# Altium footprint library PCBLIB.PcbLib: 557 footprints (part 7 of 36)
Each footprint in its own frame and in the unit in brackets; x right, y up, seen from the top. Pads: shape width x height; smd on the part's side, far side on the other; paste and mask are expansions set on the pad; w line width, h text height; cw(c..) or ccw(c..) is an arc to the next point about the centre after c.
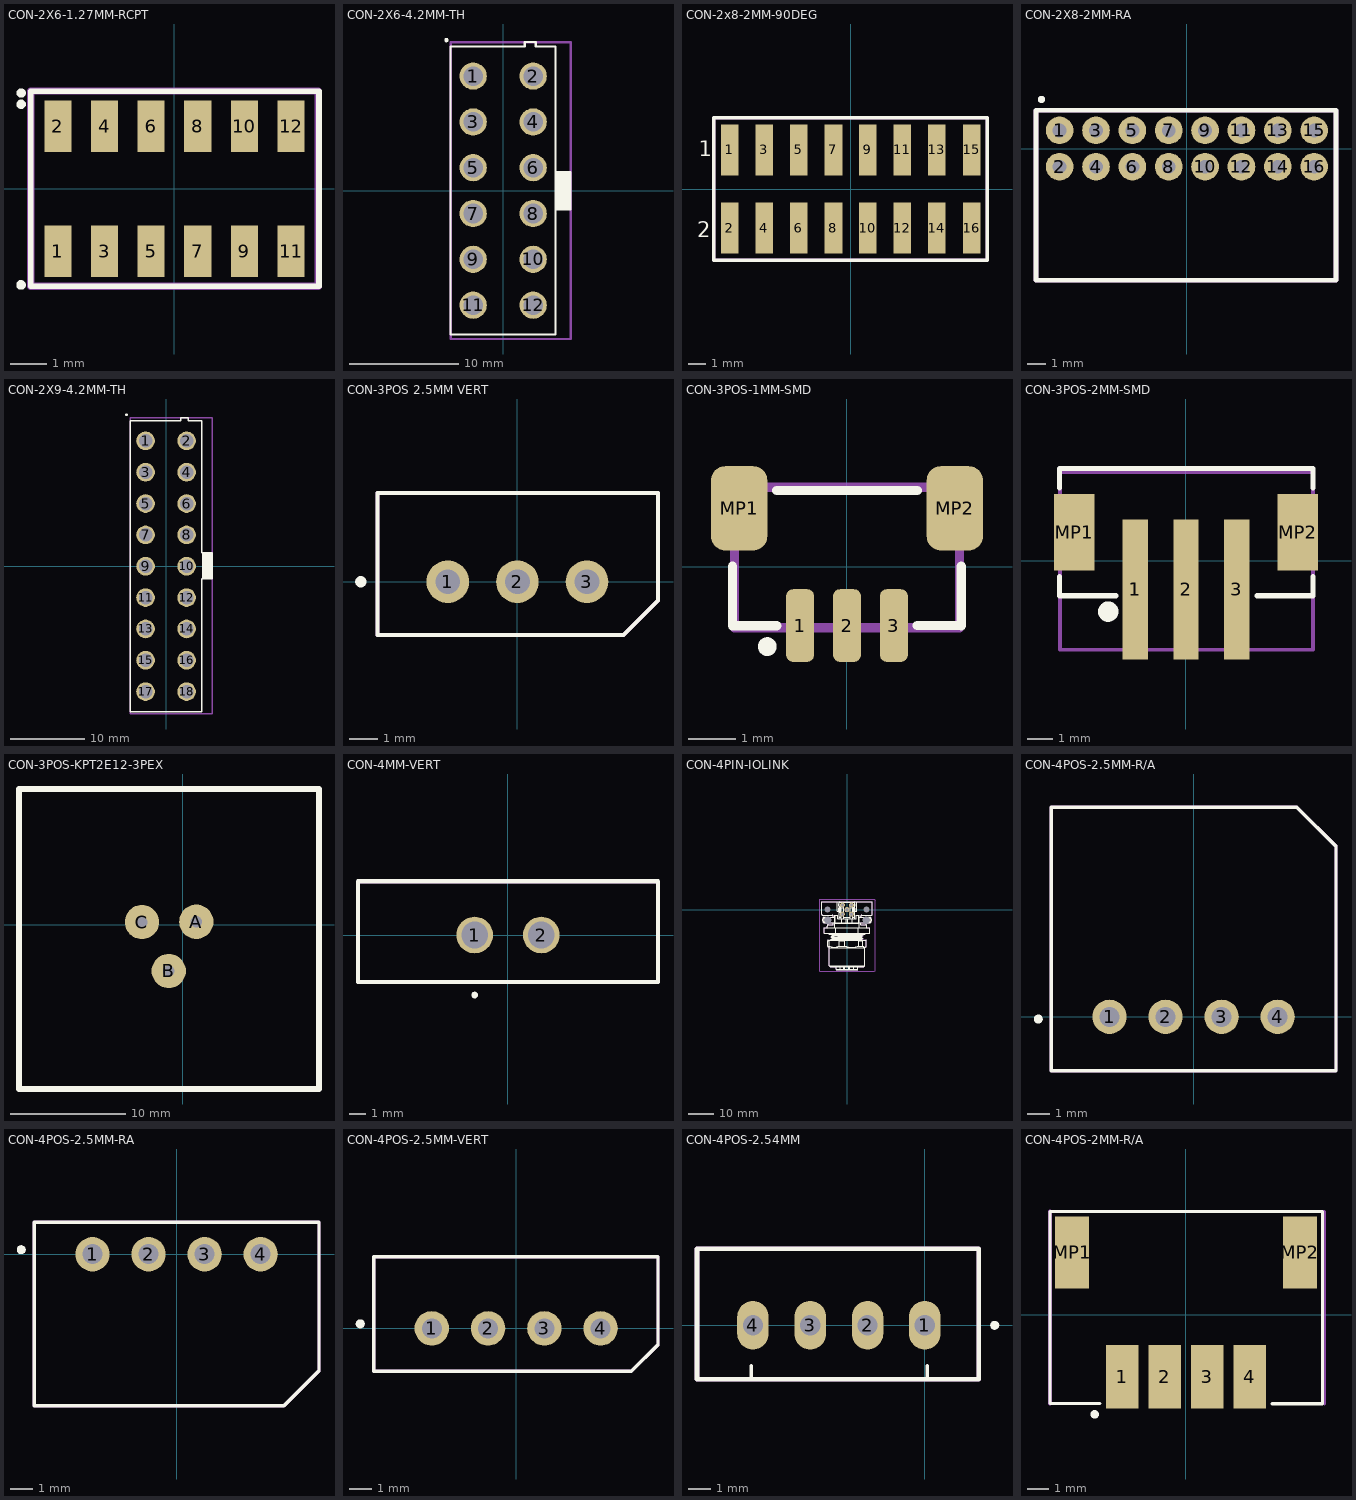
[diagram p6: the footprints below, top view; thin cyan lines are the x and y axes]

## CON-2X6-1.27MM-RCPT [mm] "CONN RCPT 12POS 0.05 GOLD SMD"
pads (12):
  rect 0.74x1.4 smd mask+0.05: 1(-3.175,-1.7) 2(-3.175,1.7) 3(-1.905,-1.7) 4(-1.905,1.7) 5(-0.635,-1.7) 6(-0.635,1.7) 7(0.635,-1.7) 8(0.635,1.7) 9(1.905,-1.7) 10(1.905,1.7) 11(3.175,-1.7) 12(3.175,1.7)
Top Overlay:
  circle w0.15: c-4.18,-2.62 r0.055
  circle w0.15: c-4.176,2.3 r0.051
  circle w0.15: c-4.176,2.605 r0.051
  lines w0.15: -3.912,-2.66 -3.912,2.66 1.79,2.66 3.937,2.66 3.937,-2.66 -3.912,-2.66
ASM Top:
  lines w0.2: -3.912,-2.66 3.912,-2.66 3.912,2.66 -3.912,2.66 -3.912,-2.66
  text ".designator" at -2.85,-0.24 h0.8
3D body "FLE-106-01-G-DV-K-TR.stp": height 4.69, standoff 0.01, extent -3.867,-2.297 3.867,2.297

## CON-2X6-4.2MM-TH [mm]
pads (12):
  round 2.5 hole 1.8: 1(-2.75,10.5) 2(2.75,10.5) 3(-2.75,6.3) 4(2.75,6.3) 5(-2.75,2.1) 6(2.75,2.1) 7(-2.75,-2.1) 8(2.75,-2.1) 9(-2.75,-6.3) 10(2.75,-6.3) 11(-2.75,-10.5) 12(2.75,-10.5)
Top Overlay:
  circle w0.2: c-5.2,13.8 r0.1
  rectangle: 4.787,-1.7 6.187,1.7
  lines w0.2: 4.787,12.224 4.787,-1.7 ; 4.787,-1.7 6.187,-1.7 6.187,1.7 4.787,1.7 4.787,13.224 2.988,13.224 2.988,13.624 1.977,13.624 1.977,13.224 -4.813,13.224 -4.813,-13.2 4.787,-13.2 4.787,-1.7
ASM Top:
  lines w0.2: -4.812,-13.6 6.188,-13.6 6.188,13.6 -4.812,13.6 -4.812,-13.6
  text ".designator" at -2.1,0 h0.8
3D body "039293126.stp": height 12.81, standoff -3.49, extent -4.8,-13.6 6.2,13.6

## CON-2x8-2MM-90DEG [mil]
pads (16):
  rect 40x116 smd: 1(-276,89) 2(-276,-89) 3(-197,89) 4(-197,-89) 5(-118,89) 6(-118,-89) 7(-39,89) 8(-39,-89) 9(39,89) 10(39,-89) 11(118,89) 12(118,-89) 13(197,89) 14(197,-89) 15(276,89) 16(276,-89)
Top Overlay:
  lines w8: -312,-163 -312,163 312,163 312,-163 -312,-163
  text "1" at -346.46,62.99 h60
  text "2" at -350.39,-122.05 h60
ASM Top:
  lines w8: -312,-163 -312,163 312,163 312,-163 -312,-163
  text ".designator" at -299,-13 h31.5
3D body "2x8 2mm 90.stp": height 235.5, standoff 0.5, extent -313.95,-139.99 315.97,138.01

## CON-2X8-2MM-RA [mil]
pads (16):
  round 60 hole 30: 1(-275.59,39.37) 2(-275.59,-39.37) 3(-196.85,39.37) 4(-196.85,-39.37) 5(-118.11,39.37) 6(-118.11,-39.37) 7(-39.37,39.37) 8(-39.37,-39.37) 9(39.37,39.37) 10(39.37,-39.37) 11(118.11,39.37) 12(118.11,-39.37) 13(196.85,39.37) 14(196.85,-39.37) 15(275.59,39.37) 16(275.59,-39.37)
Top Overlay:
  circle w7.87: c-314.96,106.3 r3.94
  lines w10: -326.77,-285.52 -326.77,82.68 322.83,82.68 322.83,-285.52 -326.77,-285.52
ASM Top:
  lines w10: -326.77,-285.52 322.83,-285.52 322.83,82.68 -326.77,82.68 -326.77,-285.52
  text ".designator" at -303.15,-122.05 h31.5
3D body "2x8-2MM-RA-HEADER.stp": height 159.3, standoff -116.61, extent -314.96,-285.52 314.96,49.3

## CON-2X9-4.2MM-TH [mm]
pads (18):
  round 2.5 hole 1.8: 1(-2.75,16.8) 2(2.75,16.8) 3(-2.75,12.6) 4(2.75,12.6) 5(-2.75,8.4) 6(2.75,8.4) 7(-2.75,4.2) 8(2.75,4.2) 9(-2.75,0) 10(2.75,0) 11(-2.75,-4.2) 12(2.75,-4.2) 13(-2.75,-8.4) 14(2.75,-8.4) 15(-2.75,-12.6) 16(2.75,-12.6) 17(-2.75,-16.8) 18(2.75,-16.8)
Top Overlay:
  circle w0.2: c-5.3,20.3 r0.1
  rectangle: 4.787,-1.7 6.187,1.7
  lines w0.2: 4.787,4.6 4.787,18.524 ; -4.813,-19.5 -4.813,19.524 1.977,19.524 1.977,19.924 2.988,19.924 2.988,19.524 4.787,19.524 4.787,1.8 6.187,1.8 6.187,-1.7 4.787,-1.7 4.787,-19.5 -4.813,-19.5
ASM Top:
  lines w0.2: -4.812,-19.8 -4.812,19.9 6.188,19.9 6.188,-19.8 -4.812,-19.8
  text ".designator" at -2.75,0 h0.8
3D body "039281183.stp": height 12.81, standoff -3.49, extent -4.8,-19.9 6.2,19.9

## CON-3POS 2.5MM VERT [mil]
pads (3):
  round 60 hole 35: 1(-98,0) 2(0,0) 3(98,0)
Top Overlay:
  circle w7.87: c-220.47,0 r3.94
  lines w6: -197,-75 149.41,-75 198,-26.41 198,125 -197,125 -197,-75
ASM Top:
  lines w6: -197,-75 149.41,-75 198,-26.41 198,125 -197,125 -197,-75
  text ".designator" at -47.24,47.24 h31.5
3D body "022035035.stp": height 231.14, standoff -138.94, extent -194.88,-72.05 194.88,120.87

## CON-3POS-1MM-SMD [mm]
pads (5):
  rrect50% 0.6x1.55 smd mask+0.05: 1(-1,-1.25) 2(0,-1.25) 3(1,-1.25)
  rrect50% 1.2x1.8 smd mask+0.05: MP1(-2.3,1.25) MP2(2.3,1.25)
Top Overlay:
  circle w0.2: c-1.7,-1.7 r0.1
  lines w0.2: -2.442,0.015 -2.442,-1.251 -1.5,-1.251 ; -1.5,1.631 1.5,1.631 ; 1.5,-1.25 2.44,-1.25 ; 2.441,-1.251 2.441,0.015
ASM Top:
  lines w0.2: -2.4,1.7 -2.4,-1.3 2.4,-1.3 2.4,1.7 -2.35,1.7
  text ".designator" at -0.4,-0.2 h0.8
3D body "5013310307.stp": height 5.5, standoff -0.04, extent -2.62,-1.91 2.62,1.94

## CON-3POS-2MM-SMD [mm]
pads (6):
  rect 1x5.5 smd: 1(-2,-1.125) 1(-2,-1.125) 2(0,-1.125) 3(2,-1.125)
  rect 1.6x3 smd: MP1(-4.4,1.125) MP2(4.4,1.125)
Top Overlay:
  circle w0.4: c-3.058,-1.999 r0.2
  lines w0.2: -4.975,-0.625 -4.975,-1.375 -2.75,-1.375 ; -4.975,2.875 -4.975,3.625 5,3.625 5,2.875 ; 2.8,-1.375 5,-1.375 5,-0.625
ASM Top:
  lines w0.152: -4.95,3.5 -4.95,-3.5 5,-3.5 5,1.5 5,3.5 -4.95,3.5 ; -4.95,3.5 -4.95,3.5
  text ".designator" at -1.4,-0.4 h0.8
3D body "B3B-PH-SM4-TB.STEP": height 6.61, standoff 0.01, extent -4.975,-3.5 4.975,3.5

## CON-3POS-KPT2E12-3PEX [mm]
pads (3):
  round 3 hole 1: A(1.18,0.25) B(-1.22,-4.04) C(-3.56,0.23)
Top Overlay:
  lines w0.5: -14.282,-14.325 -14.282,11.825 11.878,11.825 11.878,-14.325 -14.282,-14.325
3D body "KPT2E123PEX.stp": height 20.39, standoff -9.37, extent -14.282,-14.325 11.878,11.825

## CON-4MM-VERT [mm]
pads (2):
  round 2.2 hole 1.6: 1(-2,0) 2(2,0)
Top Overlay:
  circle w0.2: c-2,-3.6 r0.1
  lines w0.254: -9,-2.825 9,-2.825 9,3.225 -9,3.225 -9,-2.825
ASM Top:
  lines w0.2: -9,-2.8 -9,3.2 9,3.2 9,-2.8 -9,-2.8
  text ".designator" at -1.6,-0.2 h0.8
3D body "CON-HARWIN.stp": height 5.6, standoff -3.3, extent -9,-2.825 9,3.225

## CON-4PIN-IOLINK [mm]
height 32
pads (9):
  round 1.9 hole 1.3: 1(-1.77,1.77) 2(1.77,1.77) 3(1.77,-1.77) 4(-1.77,-1.77) 5(0,0)
  round 0 hole 2.35 unplated: MH1(-7.5,0) MH2(7.5,0)
  round 0 hole 2.8 unplated: MH3(-7.5,-4) MH4(7.5,-4)
Top Overlay:
  drawing of 442 lines, arcs and shapes, not listed
Mechanical 15:
  lines w0.2: -10.5,3.237 -10.5,3.043 -10.5,3.943 -9.912,3.943 ; -10.5,3.343 -10.5,-23.257 -10.5,-24.057 10.6,-24.057 10.9,-23.757 10.9,3.643 10.6,3.943 -10.1,3.943
ASM Top:
  lines w0.2: -9.9,3.1 9.854,3.1 9.906,3.048 ; -8.144,-9.144 -7.118,-9.144 ; -7.581,-14.171 -7.581,-12.139 ; -7.565,-12.124 -7.565,-12.065 -7.347,-11.847 -6.188,-11.847 -6.093,-11.751 ; -7.558,-14.2 ccw(c-6.142,-12.953) -7.514,-14.248 ; -7.528,-14.263 -6.864,-14.882 -6.864,-21.893 -6.559,-22.198 -4.171,-22.198 -4.171,-23.165 ccw(c-3.968,-23.165) -3.968,-23.368 3.957,-23.368 ccw(c3.957,-23.165) 4.16,-23.165 4.16,-22.198 6.553,-22.198 ; -7.433,-11.938 cw(c-6.111,-13.023) -7.363,-11.858 ; -6.216,-9.652 -6.61,-9.652 cw(c-6.61,-9.144) -7.118,-9.144 ; -6.215,-10.67 -5.552,-11.053 ; -6.213,-9.655 -5.552,-10.037 -5.552,-10.274 ; -6.211,-10.664 -5.545,-10.279 ; -6.102,-11.747 -6.102,-11.62 ; -6.095,-11.613 -5.545,-11.295 ; -5.546,-11.288 -5.546,-11.049 ; -5.289,-5.086 -5.289,-5.893 -7.219,-5.893 ccw(c-7.219,-6.401) -7.727,-6.401 -7.727,-7.112 -8.804,-7.112 -8.804,-9.144 -7.118,-9.144 ; -5.289,-5.08 -9.129,-5.08 cw(c-8.134,-4.064) -9.129,-3.048 -5.289,-3.048 -5.289,-2.743 ccw(c-5.797,-2.743) -5.797,-2.235 -9.404,-2.235 cw(c-9.404,-1.727) -9.912,-1.727 -9.912,3.048 -3.054,3.048 ; -2.739,3.033 2.727,3.033 ; 3.042,3.048 9.9,3.048 9.9,-1.727 cw(c9.392,-1.727) 9.392,-2.235 5.786,-2.235 ccw(c5.786,-2.743) 5.278,-2.743 5.278,-3.048 9.118,-3.048 cw(c8.122,-4.064) 9.118,-5.08 5.278,-5.08 5.278,-5.893 7.208,-5.893 cw(c7.208,-6.401) 7.716,-6.401 7.716,-7.112 8.793,-7.112 8.793,-9.144 7.106,-9.144 cw(c6.598,-9.144) 6.598,-9.652 5.381,-9.652 6.233,-10.145 5.533,-10.549 ; 5.539,-10.787 5.539,-10.549 ; 5.54,-10.791 6.21,-11.178 ; 6.208,-11.175 5.533,-11.565 5.533,-11.789 7.23,-11.789 7.565,-12.124 ; 6.548,-22.198 6.852,-21.893 6.852,-14.882 7.582,-14.202 ; 7.55,-12.11 7.57,-12.139 7.57,-14.171
  text ".designator" at -2.4,-4.4 h0.8
3D body "c-t4145515041-001-a-3d.stp": height 16.01, standoff -3.59, extent -9.75,-22.967 9.75,3.033

## CON-4POS-2.5MM-R/A [mil] "CONN HEADER R/A 4POS 2.5MM"
pads (4):
  round 60 hole 35: 1(-147,0) 2(-49,0) 3(49,0) 4(147,0)
Top Overlay:
  circle w7.87: c-271.65,-3.94 r3.94
  lines w6: -249,-94.02 249,-94.02 249,298.24 180.59,366.65 -249,366.65 -249,-94.02
ASM Top:
  lines w6: -249,-94.65 -249,366.65 180.59,366.65 249,298.24 249,-94.65 -249,-94.65
  text ".designator" at -62.99,90.55 h31.5
3D body "User Library-jst-s4b-xh-a.STEP": height 240.66, standoff -133.36, extent -245.07,-90.23 243.12,362.53

## CON-4POS-2.5MM-RA [mil]
pads (4):
  round 60 hole 35: 1(-147,0) 2(-49,0) 3(49,0) 4(147,0)
Top Overlay:
  circle w7.87: c-271.65,7.87 r3.94
  lines w6: -249,-265 -249,56 249,56 249,-203.76 187.76,-265 -249,-265
ASM Top:
  lines w6: -249,-265 -249,56 249,56 249,-203.76 187.76,-265 -249,-265
  text ".designator" at -47.24,-51.18 h31.5
3D body "022057045.stp": height 196.46, standoff -134.25, extent -244,-260.03 244.19,51

## CON-4POS-2.5MM-VERT [mil]
pads (4):
  round 60 hole 35: 1(-147,0) 2(-49,0) 3(49,0) 4(147,0)
Top Overlay:
  circle w7.87: c-271.65,7.87 r3.94
  lines w6: -248,-75 200.59,-75 247,-28.59 247,125 -248,125 -248,-75
ASM Top:
  lines w6: -248,-75 200.59,-75 247,-28.59 247,125 -248,125 -248,-75
  text ".designator" at -51.18,47.24 h31.5
3D body "022035045.stp": height 231.14, standoff -138.94, extent -242.09,-70.92 246.1,122

## CON-4POS-2.54MM [mil] "2.54 mm (100mil)"
height 236.22
pads (4):
  oval 55x85 hole 35.43: 1(0,0) 2(-100,0) 3(-200,0) 4(-300,0)
Top Overlay:
  circle w7.87: c122.05,0 r3.94
  lines w5.98: -303.15,-94.49 -303.15,-70.87 ; 3.94,-94.49 3.94,-70.87
  lines w7.87: -397.64,-94.49 -397.64,133.86 94.49,133.86 94.49,-94.49 -397.64,-94.49
ASM Top:
  lines w7.87: -397.64,-94.49 94.49,-94.49 94.49,133.86 -397.64,133.86 -397.64,-94.49
  text ".designator" at -251.97,3.94 h31.5
3D body "JST XH 4 B4B-XH-A.STEP": height 275.59, standoff -135.83, extent -395.67,-93.51 92.52,132.87

## CON-4POS-2MM-R/A [mm] "CONN HEADER SMD R/A 4POS 2MM"
pads (6):
  rect 1.524x3 smd: 1(-3.003,-2.924) 2(-0.996,-2.924) 3(1.004,-2.924) 4(3.004,-2.924)
  rect 1.6x3.4 smd: MP1(-5.364,2.924) MP2(5.365,2.924)
Top Overlay:
  circle w0.2: c-4.3,-4.7 r0.1
  lines w0.152: -4.046,-4.194 -6.404,-4.194 -6.404,4.854 6.43,4.854 6.43,-4.196 4.046,-4.196
ASM Top:
  lines w0.152: -6.404,4.854 6.526,4.854 6.526,2.609 6.526,-1.996 6.526,-4.196
  lines w0.2: -6.404,-4.194 -6.404,4.854
  text ".designator" at -2.604,0.204 h0.8
3D body "S4B-PH-SM4-TB.stp": height 4.81, standoff 0.01, extent -5.895,-4.206 6.006,4.394